# Altium footprint library GyokuRe.PcbLib: 1248 footprints (part 8 of 78)
Each footprint in its own frame and in the unit in brackets; x right, y up, seen from the top. Pads: shape width x height; smd on the part's side, far side on the other; paste and mask are expansions set on the pad; w line width, h text height; cw(c..) or ccw(c..) is an arc to the next point about the centre after c.
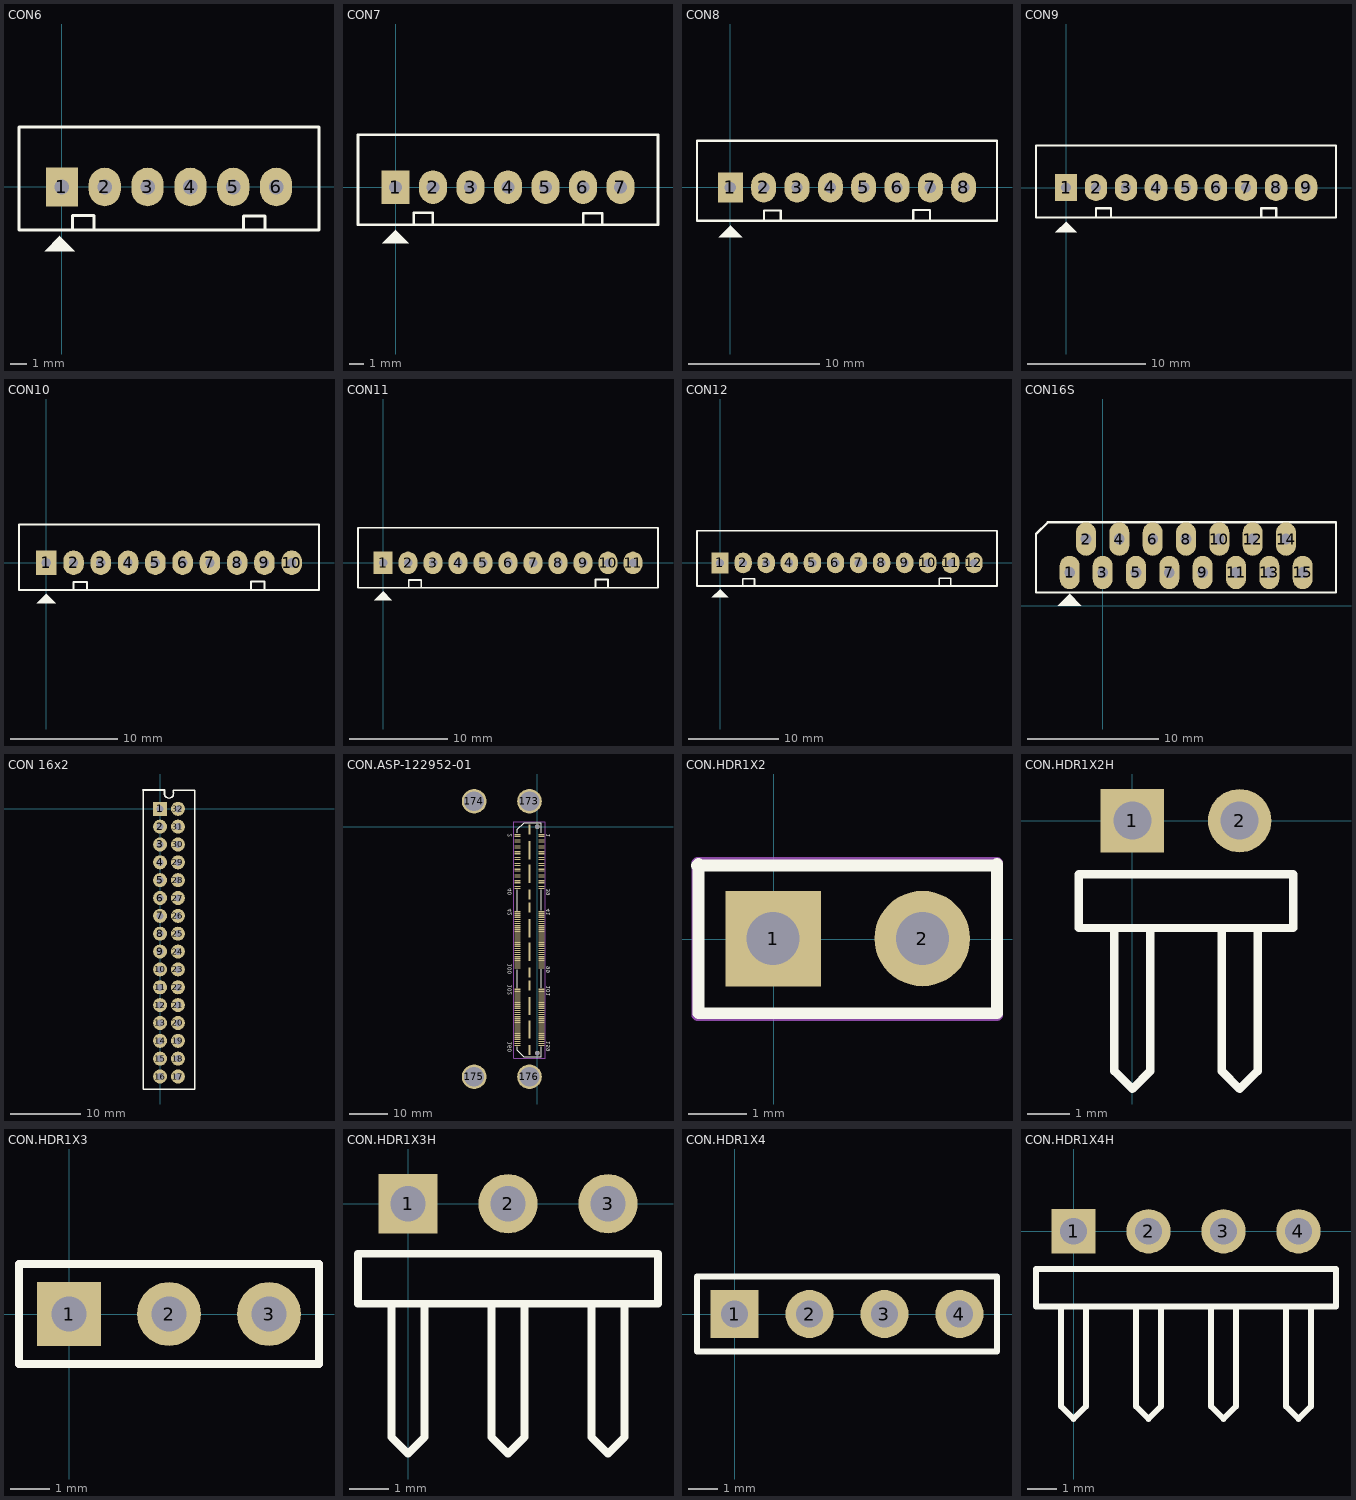
[diagram p7: the footprints below, top view; thin cyan lines are the x and y axes]

## CON6 [mil] "CON6"
height 200
pads (6):
  rect 75x90 hole 34: 1(0,0)
  oval 75x90 hole 34: 2(100,0) 3(200,0) 4(300,0) 5(400,0) 6(500,0)
Top Overlay:
  region: -40.5,-149.5 30.5,-149.5 -4.5,-114.5 -4.5,-113.5
  lines w7: 25,-97 25,-67 75,-67 75,-97 ; 424,-98 424,-68 474,-68 474,-98 ; -100,-100 -100,140 600,140 600,0 600,-100 -100,-100

## CON7 [mil] "CON7"
height 200
pads (7):
  rect 75x90 hole 34: 1(0,0)
  oval 75x90 hole 34: 2(100,0) 3(200,0) 4(300,0) 5(400,0) 6(500,0) 7(600,0)
Top Overlay:
  region: -35.5,-149.5 35.5,-149.5 0.5,-114.5 0.5,-113.5
  lines w7: 49,-98 49,-68 99,-68 99,-98 ; 501,-99 501,-69 551,-69 551,-99 ; -100,-100 -100,140 700,140 700,0 700,-100 -100,-100

## CON8 [mil] "CON8"
height 200
pads (8):
  rect 75x90 hole 34: 1(0,0)
  oval 75x90 hole 34: 2(100,0) 3(200,0) 4(300,0) 5(400,0) 6(500,0) 7(600,0) 8(700,0)
Top Overlay:
  region: -35.5,-149.5 35.5,-149.5 0.5,-114.5 0.5,-113.5
  lines w7: 101,-99 101,-69 151,-69 151,-99 ; 549,-98 549,-68 599,-68 599,-98 ; -100,-100 800,-100 800,0 800,140 -100,140 -100,-100

## CON9 [mil] "CON9"
height 200
pads (9):
  rect 75x90 hole 34: 1(0,0)
  oval 75x90 hole 34: 2(100,0) 3(200,0) 4(300,0) 5(400,0) 6(500,0) 7(600,0) 8(700,0) 9(800,0)
Top Overlay:
  region: -35.5,-149.5 35.5,-149.5 0.5,-114.5 0.5,-113.5
  lines w7: 100,-99 100,-69 150,-69 150,-99 ; 651,-99 651,-69 701,-69 701,-99 ; -100,-100 -100,140 900,140 900,0 900,-100 -100,-100

## CON10 [mil] "CON10"
height 200
pads (10):
  rect 75x90 hole 34: 1(0,0)
  oval 75x90 hole 34: 2(100,0) 3(200,0) 4(300,0) 5(400,0) 6(500,0) 7(600,0) 8(700,0) 9(800,0) 10(900,0)
Top Overlay:
  region: -35.5,-149.5 35.5,-149.5 0.5,-114.5 0.5,-113.5
  lines w7: 100,-100 100,-70 150,-70 150,-100 ; 750,-99 750,-69 800,-69 800,-99 ; -100,-100 1000,-100 1000,0 1000,140 -100,140 -100,-100

## CON11 [mil] "CON11"
height 200
pads (11):
  rect 75x90 hole 34: 1(0,0)
  oval 75x90 hole 34: 2(100,0) 3(200,0) 4(300,0) 5(400,0) 6(500,0) 7(600,0) 8(700,0) 9(800,0) 10(900,0) 11(1000,0)
Top Overlay:
  region: -35.5,-149.5 35.5,-149.5 0.5,-114.5 0.5,-113.5
  lines w7: 103,-99 103,-69 153,-69 153,-99 ; 850,-97 850,-67 900,-67 900,-97 ; -100,-100 1100,-100 1100,0 1100,140 -100,140 -100,-100

## CON12 [mil] "CON12"
height 200
pads (12):
  rect 75x90 hole 34: 1(0,0)
  oval 75x90 hole 34: 2(100,0) 3(200,0) 4(300,0) 5(400,0) 6(500,0) 7(600,0) 8(700,0) 9(800,0) 10(900,0) 11(1000,0) 12(1100,0)
Top Overlay:
  region: -35.5,-149.5 35.5,-149.5 0.5,-114.5 0.5,-113.5
  lines w7: 99,-99 99,-69 149,-69 149,-99 ; 950,-97 950,-67 1000,-67 1000,-97 ; -100,-100 1200,-100 1200,0 1200,140 -100,140 -100,-100

## CON16S [mil] "Jam 16S"
pads (15):
  oval 60x100 hole 32: 1(-99,100) 2(-50,200) 3(0,100) 4(50,200) 5(100,100) 6(150,200) 7(200,100) 8(250,200) 9(300,100) 10(350,200) 11(400,100) 12(450,200) 13(500,100) 14(550,200) 15(600,100)
Top Overlay:
  region: -135.5,0.5 -64.5,0.5 -99.5,35.5 -99.5,36.5
  lines w7: -200,40 -200,215 -165,250 700,250 700,40 -200,40

## CON 16x2 [mm]
pads (32):
  rect 2x2 hole 1: 1(0,0)
  round 2 hole 1: 2(0,-2.54) 3(0,-5.08) 4(0,-7.62) 5(0,-10.16) 6(0,-12.7) 7(0,-15.24) 8(0,-17.78) 9(0,-20.32) 10(0,-22.86) 11(0,-25.4) 12(0,-27.94) 13(0,-30.48) 14(0,-33.02) 15(0,-35.56) 16(0,-38.1) 17(2.54,-38.1) 18(2.54,-35.56) 19(2.54,-33.02) 20(2.54,-30.48) 21(2.54,-27.94) 22(2.54,-25.4) 23(2.54,-22.86) 24(2.54,-20.32) 25(2.54,-17.78) 26(2.54,-15.24) 27(2.54,-12.7) 28(2.54,-10.16) 29(2.54,-7.62) 30(2.54,-5.08) 31(2.54,-2.54) 32(2.54,0)
Top Overlay:
  lines w0.2: -2.413,2.667 -2.413,-39.878 4.953,-39.878 4.953,2.667 1.905,2.667 1.905,2.286 cw(c1.27,2.17) 0.635,2.286
  lines w0.254: -2.413,2.667 0.635,2.667 0.635,2.032

## CON.ASP-122952-01 [mm] "HSMC Male Connector"
pads (178):
  rect 1.45x0.3 smd paste+0 mask+0: 1(1.06,-1.99) 2(-5.12,-1.99) 3(1.06,-2.49) 4(-5.12,-2.49) 5(1.06,-3.49) 6(-5.12,-3.49) 7(1.06,-3.99) 8(-5.12,-3.99) 9(1.06,-4.99) 10(-5.12,-4.99) 11(1.06,-5.49) 12(-5.12,-5.49) 13(1.06,-6.49) 14(-5.12,-6.49) 15(1.06,-6.99) 16(-5.12,-6.99) 17(1.06,-7.99) 18(-5.12,-7.99) 19(1.06,-8.49) 20(-5.12,-8.49) 21(1.06,-9.49) 22(-5.12,-9.49) 23(1.06,-9.99) 24(-5.12,-9.99) 25(1.06,-10.99) 26(-5.12,-10.99) 27(1.06,-11.49) 28(-5.12,-11.49) 29(1.06,-12.49) 30(-5.12,-12.49) 31(1.06,-12.99) 32(-5.12,-12.99) 33(1.06,-13.99) 34(-5.12,-13.99) 35(1.06,-14.49) 36(-5.12,-14.49) 37(1.06,-15.49) 38(-5.12,-15.49) 39(1.06,-15.99) 40(-5.12,-15.99) 41(1.06,-21.99) 42(-5.12,-21.99) 43(1.06,-22.49) 44(-5.12,-22.49) 45(1.06,-22.99) 46(-5.12,-22.99) 47(1.06,-23.49) 48(-5.12,-23.49) 49(1.06,-23.99) 50(-5.12,-23.99) 51(1.06,-24.49) 52(-5.12,-24.49) 53(1.06,-24.99) 54(-5.12,-24.99) 55(1.06,-25.49) 56(-5.12,-25.49) 57(1.06,-25.99) 58(-5.12,-25.99) 59(1.06,-26.49) 60(-5.12,-26.49) 61(1.06,-26.99) 62(-5.12,-26.99) 63(1.06,-27.49) 64(-5.12,-27.49) 65(1.06,-27.99) 66(-5.12,-27.99) 67(1.06,-28.49) 68(-5.12,-28.49) 69(1.06,-28.99) 70(-5.12,-28.99) 71(1.06,-29.49) 72(-5.12,-29.49) 73(1.06,-29.99) 74(-5.12,-29.99) 75(1.06,-30.49) 76(-5.12,-30.49) 77(1.06,-30.99) 78(-5.12,-30.99) 79(1.06,-31.49) 80(-5.12,-31.49) 81(1.06,-31.99) 82(-5.12,-31.99) 83(1.06,-32.49) 84(-5.12,-32.49) 85(1.06,-32.99) 86(-5.12,-32.99) 87(1.06,-33.49) 88(-5.12,-33.49) 89(1.06,-33.99) 90(-5.12,-33.99) 91(1.06,-34.49) 92(-5.12,-34.49) 93(1.06,-34.99) 94(-5.12,-34.99) 95(1.06,-35.49) 96(-5.12,-35.49) 97(1.06,-35.99) 98(-5.12,-35.99) 99(1.06,-36.49) 100(-5.12,-36.49) 101(1.06,-41.99) 102(-5.12,-41.99) 103(1.06,-42.49) 104(-5.12,-42.49) 105(1.06,-42.99) 106(-5.12,-42.99) 107(1.06,-43.49) 108(-5.12,-43.49) 109(1.06,-43.99) 110(-5.12,-43.99) 111(1.06,-44.49) 112(-5.12,-44.49) 113(1.06,-44.99) 114(-5.12,-44.99) 115(1.06,-45.49) 116(-5.12,-45.49) 117(1.06,-45.99) 118(-5.12,-45.99) 119(1.06,-46.49) 120(-5.12,-46.49) 121(1.06,-46.99) 122(-5.12,-46.99) 123(1.06,-47.49) 124(-5.12,-47.49) 125(1.06,-47.99) 126(-5.12,-47.99) 127(1.06,-48.49) 128(-5.12,-48.49) 129(1.06,-48.99) 130(-5.12,-48.99) 131(1.06,-49.49) 132(-5.12,-49.49) 133(1.06,-49.99) 134(-5.12,-49.99) 135(1.06,-50.49) 136(-5.12,-50.49) 137(1.06,-50.99) 138(-5.12,-50.99) 139(1.06,-51.49) 140(-5.12,-51.49) 141(1.06,-51.99) 142(-5.12,-51.99) 143(1.06,-52.49) 144(-5.12,-52.49) 145(1.06,-52.99) 146(-5.12,-52.99) 147(1.06,-53.49) 148(-5.12,-53.49) 149(1.06,-53.99) 150(-5.12,-53.99) 151(1.06,-54.49) 152(-5.12,-54.49) 153(1.06,-54.99) 154(-5.12,-54.99) 155(1.06,-55.49) 156(-5.12,-55.49) 157(1.06,-55.99) 158(-5.12,-55.99) 159(1.06,-56.49) 160(-5.12,-56.49)
  rect 0.64x2.54 smd paste+0 mask+0: 161(-2.03,-57.715) 164(-2.03,-40.99) 165(-2.03,-37.64) 168(-2.03,-20.915) 169(-2.03,-17.49) 172(-2.03,-0.765)
  rect 0.64x4.7 smd paste+0 mask+0: 162(-2.03,-52.39) 163(-2.03,-46.315) 166(-2.03,-32.315) 167(-2.03,-26.24) 170(-2.03,-12.165) 171(-2.03,-6.09)
  round 6.35 hole 5.08: 173(-2.039,6.544) 174(-16.339,6.544) 175(-16.339,-64.567) 176(-2.039,-64.567)
  round 1.2 hole 1.1 paste+0 mask+0: HOLE(0,-58.48) HOLE(0,0)
Top Overlay:
  lines w0.2: -5.19,-41.69 -5.19,-36.94 ; -5.165,-56.79 -5.165,-57.79 -3.49,-59.465 1.01,-59.465 1.01,-56.84 ; -5.165,-21.665 -5.165,-16.315 ; -5.165,-1.64 -5.165,-0.74 ; -5.165,-0.715 -3.44,1.01 1.01,1.01 1.01,-1.64 ; 1.01,-41.59 1.01,-36.84 ; 1.01,-21.615 1.01,-16.34
  text "1" at 3.325,-1.85 h1
  text "2" at -6.625,-1.85 h1
  text "40" at -6.6,-15.95 h1
  text "42" at -6.6,-21.2 h1
  text "100" at -6.6,-35.425 h1
  text "102" at -6.6,-40.775 h1
  text "160" at -6.6,-55.575 h1
  text "39" at 3.325,-16.025 h1
  text "41" at 3.325,-21.15 h1
  text "99" at 3.325,-36.075 h1
  text "101" at 3.325,-41.125 h1
  text "159" at 3.35,-55.35 h1
Mechanical 13:
  lines w0.2: -6.115,-59.74 2.06,-59.74 2.06,1.26 -6.115,1.26 -6.115,-59.74
3D body: height 3.5, standoff 0.05, extent -2.227,-37.465 -1.852,-20.99
3D body: height 3.5, standoff 0.05, extent -2.227,-58.165 -1.852,-41.765
3D body: height 1.78, standoff 0.05, extent -4.54,-58.84 0.324,0.46
3D body: height 3.5, standoff 0.05, extent -2.227,-16.665 -1.852,-0.265
3D body: height 0.75, standoff 0, extent -0.45,-0.425 0.45,0.475
3D body: height 0.75, standoff 0, extent -0.45,-58.93 0.45,-58.03
3D body: height 0.2, standoff 0.01, extent 0.435,-2.09 1.385,-1.89
3D body: height 4.27, standoff 0.1, extent -4.94,-20.815 0.785,-16.865
3D body: height 4.27, standoff 0.1, extent -4.94,-41.615 0.785,-37.59
3D body: height 0.2, standoff 0.01, extent 0.435,-2.59 1.385,-2.39
3D body: height 0.2, standoff 0.01, extent 0.435,-4.09 1.385,-3.89
3D body: height 0.2, standoff 0.01, extent 0.435,-3.59 1.385,-3.39
3D body: height 0.2, standoff 0.01, extent 0.435,-5.09 1.385,-4.89
3D body: height 0.2, standoff 0.01, extent 0.435,-5.59 1.385,-5.39
3D body: height 0.2, standoff 0.01, extent 0.435,-6.59 1.385,-6.39
3D body: height 0.2, standoff 0.01, extent 0.435,-7.09 1.385,-6.89
3D body: height 0.2, standoff 0.01, extent 0.435,-8.09 1.385,-7.89
3D body: height 0.2, standoff 0.01, extent 0.435,-8.59 1.385,-8.39
3D body: height 0.2, standoff 0.01, extent 0.435,-9.59 1.385,-9.39
3D body: height 0.2, standoff 0.01, extent 0.435,-10.09 1.385,-9.89
3D body: height 0.2, standoff 0.01, extent 0.435,-11.09 1.385,-10.89
3D body: height 0.2, standoff 0.01, extent 0.435,-11.59 1.385,-11.39
3D body: height 0.2, standoff 0.01, extent 0.435,-12.59 1.385,-12.39
3D body: height 0.2, standoff 0.01, extent 0.435,-13.09 1.385,-12.89
3D body: height 0.2, standoff 0.01, extent 0.435,-14.09 1.385,-13.89
3D body: height 0.2, standoff 0.01, extent 0.435,-14.59 1.385,-14.39
3D body: height 0.2, standoff 0.01, extent 0.435,-15.59 1.385,-15.39
3D body: height 0.2, standoff 0.01, extent 0.435,-16.09 1.385,-15.89
3D body: height 0.2, standoff 0.01, extent -5.44,-2.09 -4.49,-1.89
3D body: height 0.2, standoff 0.01, extent -5.44,-2.59 -4.49,-2.39
3D body: height 0.2, standoff 0.01, extent -5.44,-3.59 -4.49,-3.39
3D body: height 0.2, standoff 0.01, extent -5.44,-4.09 -4.49,-3.89
3D body: height 0.2, standoff 0.01, extent -5.44,-5.09 -4.49,-4.89
3D body: height 0.2, standoff 0.01, extent -5.44,-5.59 -4.49,-5.39
3D body: height 0.2, standoff 0.01, extent -5.44,-6.59 -4.49,-6.39
3D body: height 0.2, standoff 0.01, extent -5.44,-7.09 -4.49,-6.89
3D body: height 0.2, standoff 0.01, extent -5.44,-8.09 -4.49,-7.89
3D body: height 0.2, standoff 0.01, extent -5.44,-8.59 -4.49,-8.39
3D body: height 0.2, standoff 0.01, extent -5.44,-9.59 -4.49,-9.39
3D body: height 0.2, standoff 0.01, extent -5.44,-10.09 -4.49,-9.89
3D body: height 0.2, standoff 0.01, extent -5.44,-11.09 -4.49,-10.89
3D body: height 0.2, standoff 0.01, extent -5.44,-11.59 -4.49,-11.39
3D body: height 0.2, standoff 0.01, extent -5.44,-12.59 -4.49,-12.39
3D body: height 0.2, standoff 0.01, extent -5.44,-13.09 -4.49,-12.89
3D body: height 0.2, standoff 0.01, extent -5.44,-14.59 -4.49,-14.39
3D body: height 0.2, standoff 0.01, extent -5.44,-14.09 -4.49,-13.89
3D body: height 0.2, standoff 0.01, extent -5.44,-15.59 -4.49,-15.39
3D body: height 0.2, standoff 0.01, extent -5.44,-16.09 -4.49,-15.89
3D body: height 0.2, standoff 0.01, extent 0.435,-22.59 1.385,-22.39
3D body: height 0.2, standoff 0.01, extent 0.435,-22.09 1.385,-21.89
3D body: height 0.2, standoff 0.01, extent 0.435,-23.59 1.385,-23.39
3D body: height 0.2, standoff 0.01, extent 0.435,-23.09 1.385,-22.89
3D body: height 0.2, standoff 0.01, extent 0.435,-25.09 1.385,-24.89
3D body: height 0.2, standoff 0.01, extent 0.435,-25.59 1.385,-25.39
3D body: height 0.2, standoff 0.01, extent 0.435,-24.09 1.385,-23.89
3D body: height 0.2, standoff 0.01, extent 0.435,-24.59 1.385,-24.39
3D body: height 0.2, standoff 0.01, extent 0.435,-27.09 1.385,-26.89
3D body: height 0.2, standoff 0.01, extent 0.435,-27.59 1.385,-27.39
3D body: height 0.2, standoff 0.01, extent 0.435,-26.09 1.385,-25.89
3D body: height 0.2, standoff 0.01, extent 0.435,-26.59 1.385,-26.39
3D body: height 0.2, standoff 0.01, extent 0.435,-29.09 1.385,-28.89
3D body: height 0.2, standoff 0.01, extent 0.435,-29.59 1.385,-29.39
3D body: height 0.2, standoff 0.01, extent 0.435,-28.09 1.385,-27.89
3D body: height 0.2, standoff 0.01, extent 0.435,-28.59 1.385,-28.39
3D body: height 0.2, standoff 0.01, extent 0.435,-31.09 1.385,-30.89
3D body: height 0.2, standoff 0.01, extent 0.435,-31.59 1.385,-31.39
3D body: height 0.2, standoff 0.01, extent 0.435,-30.09 1.385,-29.89
3D body: height 0.2, standoff 0.01, extent 0.435,-30.59 1.385,-30.39
3D body: height 0.2, standoff 0.01, extent 0.435,-33.09 1.385,-32.89
3D body: height 0.2, standoff 0.01, extent 0.435,-33.59 1.385,-33.39
3D body: height 0.2, standoff 0.01, extent 0.435,-32.09 1.385,-31.89
3D body: height 0.2, standoff 0.01, extent 0.435,-32.59 1.385,-32.39
3D body: height 0.2, standoff 0.01, extent 0.435,-35.09 1.385,-34.89
3D body: height 0.2, standoff 0.01, extent 0.435,-35.59 1.385,-35.39
3D body: height 0.2, standoff 0.01, extent 0.435,-34.09 1.385,-33.89
3D body: height 0.2, standoff 0.01, extent 0.435,-34.59 1.385,-34.39
3D body: height 0.2, standoff 0.01, extent 0.435,-36.09 1.385,-35.89
3D body: height 0.2, standoff 0.01, extent 0.435,-36.59 1.385,-36.39
3D body: height 0.2, standoff 0.01, extent -5.44,-22.09 -4.49,-21.89
3D body: height 0.2, standoff 0.01, extent -5.44,-22.59 -4.49,-22.39
3D body: height 0.2, standoff 0.01, extent -5.44,-24.09 -4.49,-23.89
3D body: height 0.2, standoff 0.01, extent -5.44,-24.59 -4.49,-24.39
3D body: height 0.2, standoff 0.01, extent -5.44,-23.09 -4.49,-22.89
3D body: height 0.2, standoff 0.01, extent -5.44,-23.59 -4.49,-23.39
3D body: height 0.2, standoff 0.01, extent -5.44,-26.09 -4.49,-25.89
3D body: height 0.2, standoff 0.01, extent -5.44,-26.59 -4.49,-26.39
3D body: height 0.2, standoff 0.01, extent -5.44,-25.09 -4.49,-24.89
3D body: height 0.2, standoff 0.01, extent -5.44,-25.59 -4.49,-25.39
3D body: height 0.2, standoff 0.01, extent -5.44,-28.09 -4.49,-27.89
3D body: height 0.2, standoff 0.01, extent -5.44,-28.59 -4.49,-28.39
3D body: height 0.2, standoff 0.01, extent -5.44,-27.09 -4.49,-26.89
3D body: height 0.2, standoff 0.01, extent -5.44,-27.59 -4.49,-27.39
3D body: height 0.2, standoff 0.01, extent -5.44,-30.09 -4.49,-29.89
3D body: height 0.2, standoff 0.01, extent -5.44,-30.59 -4.49,-30.39
3D body: height 0.2, standoff 0.01, extent -5.44,-29.09 -4.49,-28.89
3D body: height 0.2, standoff 0.01, extent -5.44,-29.59 -4.49,-29.39
3D body: height 0.2, standoff 0.01, extent -5.44,-32.09 -4.49,-31.89
3D body: height 0.2, standoff 0.01, extent -5.44,-32.59 -4.49,-32.39
3D body: height 0.2, standoff 0.01, extent -5.44,-31.09 -4.49,-30.89
3D body: height 0.2, standoff 0.01, extent -5.44,-31.59 -4.49,-31.39
3D body: height 0.2, standoff 0.01, extent -5.44,-34.09 -4.49,-33.89
3D body: height 0.2, standoff 0.01, extent -5.44,-34.59 -4.49,-34.39
3D body: height 0.2, standoff 0.01, extent -5.44,-33.09 -4.49,-32.89
3D body: height 0.2, standoff 0.01, extent -5.44,-33.59 -4.49,-33.39
3D body: height 0.2, standoff 0.01, extent -5.44,-35.59 -4.49,-35.39
3D body: height 0.2, standoff 0.01, extent -5.44,-35.09 -4.49,-34.89
3D body: height 0.2, standoff 0.01, extent -5.44,-36.59 -4.49,-36.39
3D body: height 0.2, standoff 0.01, extent -5.44,-36.09 -4.49,-35.89
3D body: height 0.2, standoff 0.01, extent 0.435,-56.59 1.385,-56.39
3D body: height 0.2, standoff 0.01, extent 0.435,-56.09 1.385,-55.89
3D body: height 0.2, standoff 0.01, extent 0.435,-54.59 1.385,-54.39
3D body: height 0.2, standoff 0.01, extent 0.435,-54.09 1.385,-53.89
3D body: height 0.2, standoff 0.01, extent 0.435,-55.59 1.385,-55.39
3D body: height 0.2, standoff 0.01, extent 0.435,-55.09 1.385,-54.89
3D body: height 0.2, standoff 0.01, extent 0.435,-52.59 1.385,-52.39
3D body: height 0.2, standoff 0.01, extent 0.435,-52.09 1.385,-51.89
3D body: height 0.2, standoff 0.01, extent 0.435,-53.59 1.385,-53.39
3D body: height 0.2, standoff 0.01, extent 0.435,-53.09 1.385,-52.89
3D body: height 0.2, standoff 0.01, extent 0.435,-50.59 1.385,-50.39
3D body: height 0.2, standoff 0.01, extent 0.435,-50.09 1.385,-49.89
3D body: height 0.2, standoff 0.01, extent 0.435,-51.59 1.385,-51.39
3D body: height 0.2, standoff 0.01, extent 0.435,-51.09 1.385,-50.89
3D body: height 0.2, standoff 0.01, extent 0.435,-48.59 1.385,-48.39
3D body: height 0.2, standoff 0.01, extent 0.435,-48.09 1.385,-47.89
3D body: height 0.2, standoff 0.01, extent 0.435,-49.59 1.385,-49.39
3D body: height 0.2, standoff 0.01, extent 0.435,-49.09 1.385,-48.89
3D body: height 0.2, standoff 0.01, extent 0.435,-46.59 1.385,-46.39
3D body: height 0.2, standoff 0.01, extent 0.435,-46.09 1.385,-45.89
3D body: height 0.2, standoff 0.01, extent 0.435,-47.59 1.385,-47.39
3D body: height 0.2, standoff 0.01, extent 0.435,-47.09 1.385,-46.89
3D body: height 0.2, standoff 0.01, extent 0.435,-44.59 1.385,-44.39
3D body: height 0.2, standoff 0.01, extent 0.435,-44.09 1.385,-43.89
3D body: height 0.2, standoff 0.01, extent 0.435,-45.59 1.385,-45.39
3D body: height 0.2, standoff 0.01, extent 0.435,-45.09 1.385,-44.89
3D body: height 0.2, standoff 0.01, extent 0.435,-43.09 1.385,-42.89
3D body: height 0.2, standoff 0.01, extent 0.435,-43.59 1.385,-43.39
3D body: height 0.2, standoff 0.01, extent 0.435,-42.09 1.385,-41.89
3D body: height 0.2, standoff 0.01, extent 0.435,-42.59 1.385,-42.39
3D body: height 0.2, standoff 0.01, extent -5.44,-42.09 -4.49,-41.89
3D body: height 0.2, standoff 0.01, extent -5.44,-42.59 -4.49,-42.39
3D body: height 0.2, standoff 0.01, extent -5.44,-44.09 -4.49,-43.89
3D body: height 0.2, standoff 0.01, extent -5.44,-44.59 -4.49,-44.39
3D body: height 0.2, standoff 0.01, extent -5.44,-43.09 -4.49,-42.89
3D body: height 0.2, standoff 0.01, extent -5.44,-43.59 -4.49,-43.39
3D body: height 0.2, standoff 0.01, extent -5.44,-46.09 -4.49,-45.89
3D body: height 0.2, standoff 0.01, extent -5.44,-46.59 -4.49,-46.39
3D body: height 0.2, standoff 0.01, extent -5.44,-45.09 -4.49,-44.89
3D body: height 0.2, standoff 0.01, extent -5.44,-45.59 -4.49,-45.39
3D body: height 0.2, standoff 0.01, extent -5.44,-48.09 -4.49,-47.89
3D body: height 0.2, standoff 0.01, extent -5.44,-48.59 -4.49,-48.39
3D body: height 0.2, standoff 0.01, extent -5.44,-47.09 -4.49,-46.89
3D body: height 0.2, standoff 0.01, extent -5.44,-47.59 -4.49,-47.39
3D body: height 0.2, standoff 0.01, extent -5.44,-50.09 -4.49,-49.89
3D body: height 0.2, standoff 0.01, extent -5.44,-50.59 -4.49,-50.39
3D body: height 0.2, standoff 0.01, extent -5.44,-49.09 -4.49,-48.89
3D body: height 0.2, standoff 0.01, extent -5.44,-49.59 -4.49,-49.39
3D body: height 0.2, standoff 0.01, extent -5.44,-52.09 -4.49,-51.89
3D body: height 0.2, standoff 0.01, extent -5.44,-52.59 -4.49,-52.39
3D body: height 0.2, standoff 0.01, extent -5.44,-51.09 -4.49,-50.89
3D body: height 0.2, standoff 0.01, extent -5.44,-51.59 -4.49,-51.39
3D body: height 0.2, standoff 0.01, extent -5.44,-54.09 -4.49,-53.89
3D body: height 0.2, standoff 0.01, extent -5.44,-54.59 -4.49,-54.39
3D body: height 0.2, standoff 0.01, extent -5.44,-53.09 -4.49,-52.89
3D body: height 0.2, standoff 0.01, extent -5.44,-53.59 -4.49,-53.39
3D body: height 0.2, standoff 0.01, extent -5.44,-55.59 -4.49,-55.39
3D body: height 0.2, standoff 0.01, extent -5.44,-55.09 -4.49,-54.89
3D body: height 0.2, standoff 0.01, extent -5.44,-56.59 -4.49,-56.39
3D body: height 0.2, standoff 0.01, extent -5.44,-56.09 -4.49,-55.89
3D body: height 4.27, standoff 0.05, extent -4.05,-2.1 -3.8,-1.9
3D body: height 4.27, standoff 0.05, extent -4.05,-2.6 -3.8,-2.4
3D body: height 4.27, standoff 0.05, extent -4.05,-4.1 -3.8,-3.9
3D body: height 4.27, standoff 0.05, extent -4.05,-3.6 -3.8,-3.4
3D body: height 4.27, standoff 0.05, extent -4.05,-5.6 -3.8,-5.4
3D body: height 4.27, standoff 0.05, extent -4.05,-5.1 -3.8,-4.9
3D body: height 4.27, standoff 0.05, extent -4.05,-7.1 -3.8,-6.9
3D body: height 4.27, standoff 0.05, extent -4.05,-6.6 -3.8,-6.4
3D body: height 4.27, standoff 0.05, extent -4.05,-8.6 -3.8,-8.4
3D body: height 4.27, standoff 0.05, extent -4.05,-8.1 -3.8,-7.9
3D body: height 4.27, standoff 0.05, extent -4.05,-10.1 -3.8,-9.9
3D body: height 4.27, standoff 0.05, extent -4.05,-9.6 -3.8,-9.4
3D body: height 4.27, standoff 0.05, extent -4.05,-11.6 -3.8,-11.4
3D body: height 4.27, standoff 0.05, extent -4.05,-11.1 -3.8,-10.9
3D body: height 4.27, standoff 0.05, extent -4.05,-13.1 -3.8,-12.9
3D body: height 4.27, standoff 0.05, extent -4.05,-12.6 -3.8,-12.4
3D body: height 4.27, standoff 0.05, extent -4.05,-14.6 -3.8,-14.4
3D body: height 4.27, standoff 0.05, extent -4.05,-14.1 -3.8,-13.9
3D body: height 4.27, standoff 0.05, extent -4.05,-16.1 -3.8,-15.9
3D body: height 4.27, standoff 0.05, extent -4.05,-15.6 -3.8,-15.4
3D body: height 4.27, standoff 0.05, extent -4.05,-22.575 -3.8,-22.375
3D body: height 4.27, standoff 0.05, extent -4.05,-22.075 -3.8,-21.875
3D body: height 4.27, standoff 0.05, extent -4.05,-23.6 -3.8,-23.4
3D body: height 4.27, standoff 0.05, extent -4.05,-23.1 -3.8,-22.9
3D body: height 4.27, standoff 0.05, extent -4.05,-24.575 -3.8,-24.375
3D body: height 4.27, standoff 0.05, extent -4.05,-24.075 -3.8,-23.875
3D body: height 4.27, standoff 0.05, extent -4.05,-25.575 -3.8,-25.375
3D body: height 4.27, standoff 0.05, extent -4.05,-25.075 -3.8,-24.875
3D body: height 4.27, standoff 0.05, extent -4.05,-26.575 -3.8,-26.375
3D body: height 4.27, standoff 0.05, extent -4.05,-26.075 -3.8,-25.875
3D body: height 4.27, standoff 0.05, extent -4.05,-27.6 -3.8,-27.4
3D body: height 4.27, standoff 0.05, extent -4.05,-27.1 -3.8,-26.9
3D body: height 4.27, standoff 0.05, extent -4.05,-28.6 -3.8,-28.4
3D body: height 4.27, standoff 0.05, extent -4.05,-28.1 -3.8,-27.9
3D body: height 4.27, standoff 0.05, extent -4.05,-29.6 -3.8,-29.4
3D body: height 4.27, standoff 0.05, extent -4.05,-29.1 -3.8,-28.9
3D body: height 4.27, standoff 0.05, extent -4.05,-30.6 -3.8,-30.4
3D body: height 4.27, standoff 0.05, extent -4.05,-30.1 -3.8,-29.9
3D body: height 4.27, standoff 0.05, extent -4.05,-31.6 -3.8,-31.4
3D body: height 4.27, standoff 0.05, extent -4.05,-31.1 -3.8,-30.9
3D body: height 4.27, standoff 0.05, extent -4.05,-32.6 -3.8,-32.4
3D body: height 4.27, standoff 0.05, extent -4.05,-32.1 -3.8,-31.9
3D body: height 4.27, standoff 0.05, extent -4.05,-33.6 -3.8,-33.4
3D body: height 4.27, standoff 0.05, extent -4.05,-33.1 -3.8,-32.9
3D body: height 4.27, standoff 0.05, extent -4.05,-34.6 -3.8,-34.4
3D body: height 4.27, standoff 0.05, extent -4.05,-34.1 -3.8,-33.9
3D body: height 4.27, standoff 0.05, extent -4.05,-35.6 -3.8,-35.4
3D body: height 4.27, standoff 0.05, extent -4.05,-35.1 -3.8,-34.9
3D body: height 4.27, standoff 0.05, extent -4.05,-36.6 -3.8,-36.4
3D body: height 4.27, standoff 0.05, extent -4.05,-36.1 -3.8,-35.9
3D body: height 4.27, standoff 0.05, extent -4.05,-45.1 -3.8,-44.9
3D body: height 4.27, standoff 0.05, extent -4.05,-45.6 -3.8,-45.4
3D body: height 4.27, standoff 0.05, extent -4.05,-44.1 -3.8,-43.9
3D body: height 4.27, standoff 0.05, extent -4.05,-44.6 -3.8,-44.4
3D body: height 4.27, standoff 0.05, extent -4.05,-43.125 -3.8,-42.925
3D body: height 4.27, standoff 0.05, extent -4.05,-43.625 -3.8,-43.425
3D body: height 4.27, standoff 0.05, extent -4.05,-42.1 -3.8,-41.9
3D body: height 4.27, standoff 0.05, extent -4.05,-42.6 -3.8,-42.4
3D body: height 4.27, standoff 0.05, extent -4.05,-49.1 -3.8,-48.9
3D body: height 4.27, standoff 0.05, extent -4.05,-49.6 -3.8,-49.4
3D body: height 4.27, standoff 0.05, extent -4.05,-48.1 -3.8,-47.9
3D body: height 4.27, standoff 0.05, extent -4.05,-48.6 -3.8,-48.4
3D body: height 4.27, standoff 0.05, extent -4.05,-47.125 -3.8,-46.925
3D body: height 4.27, standoff 0.05, extent -4.05,-47.625 -3.8,-47.425
3D body: height 4.27, standoff 0.05, extent -4.05,-46.1 -3.8,-45.9
3D body: height 4.27, standoff 0.05, extent -4.05,-46.6 -3.8,-46.4
3D body: height 4.27, standoff 0.05, extent -4.05,-53.1 -3.8,-52.9
3D body: height 4.27, standoff 0.05, extent -4.05,-53.6 -3.8,-53.4
3D body: height 4.27, standoff 0.05, extent -4.05,-52.1 -3.8,-51.9
3D body: height 4.27, standoff 0.05, extent -4.05,-52.6 -3.8,-52.4
3D body: height 4.27, standoff 0.05, extent -4.05,-51.125 -3.8,-50.925
3D body: height 4.27, standoff 0.05, extent -4.05,-51.625 -3.8,-51.425
3D body: height 4.27, standoff 0.05, extent -4.05,-50.1 -3.8,-49.9
3D body: height 4.27, standoff 0.05, extent -4.05,-50.6 -3.8,-50.4
3D body: height 4.27, standoff 0.05, extent -4.05,-56.1 -3.8,-55.9
3D body: height 4.27, standoff 0.05, extent -4.05,-56.6 -3.8,-56.4
3D body: height 4.27, standoff 0.05, extent -4.05,-55.125 -3.8,-54.925
3D body: height 4.27, standoff 0.05, extent -4.05,-55.625 -3.8,-55.425
3D body: height 4.27, standoff 0.05, extent -4.05,-54.1 -3.8,-53.9
3D body: height 4.27, standoff 0.05, extent -4.05,-54.6 -3.8,-54.4
3D body: height 4.27, standoff 0.05, extent -0.35,-56.6 -0.1,-56.4
3D body: height 4.27, standoff 0.05, extent -0.35,-56.1 -0.1,-55.9
3D body: height 4.27, standoff 0.05, extent -0.35,-55.6 -0.1,-55.4
3D body: height 4.27, standoff 0.05, extent -0.35,-55.1 -0.1,-54.9
3D body: height 4.27, standoff 0.05, extent -0.35,-54.6 -0.1,-54.4
3D body: height 4.27, standoff 0.05, extent -0.35,-54.1 -0.1,-53.9
3D body: height 4.27, standoff 0.05, extent -0.35,-53.6 -0.1,-53.4
3D body: height 4.27, standoff 0.05, extent -0.35,-53.1 -0.1,-52.9
3D body: height 4.27, standoff 0.05, extent -0.35,-52.6 -0.1,-52.4
3D body: height 4.27, standoff 0.05, extent -0.35,-52.1 -0.1,-51.9
3D body: height 4.27, standoff 0.05, extent -0.35,-51.6 -0.1,-51.4
3D body: height 4.27, standoff 0.05, extent -0.35,-51.1 -0.1,-50.9
3D body: height 4.27, standoff 0.05, extent -0.35,-50.6 -0.1,-50.4
3D body: height 4.27, standoff 0.05, extent -0.35,-50.1 -0.1,-49.9
3D body: height 4.27, standoff 0.05, extent -0.35,-49.6 -0.1,-49.4
3D body: height 4.27, standoff 0.05, extent -0.35,-49.1 -0.1,-48.9
3D body: height 4.27, standoff 0.05, extent -0.35,-43.6 -0.1,-43.4
3D body: height 4.27, standoff 0.05, extent -0.35,-43.1 -0.1,-42.9
3D body: height 4.27, standoff 0.05, extent -0.35,-48.6 -0.1,-48.4
3D body: height 4.27, standoff 0.05, extent -0.35,-48.1 -0.1,-47.9
3D body: height 4.27, standoff 0.05, extent -0.35,-47.6 -0.1,-47.4
3D body: height 4.27, standoff 0.05, extent -0.35,-47.1 -0.1,-46.9
3D body: height 4.27, standoff 0.05, extent -0.35,-44.1 -0.1,-43.9
3D body: height 4.27, standoff 0.05, extent -0.35,-44.6 -0.1,-44.4
3D body: height 4.27, standoff 0.05, extent -0.35,-45.1 -0.1,-44.9
3D body: height 4.27, standoff 0.05, extent -0.35,-45.6 -0.1,-45.4
3D body: height 4.27, standoff 0.05, extent -0.35,-46.1 -0.1,-45.9
3D body: height 4.27, standoff 0.05, extent -0.35,-46.6 -0.1,-46.4
3D body: height 4.27, standoff 0.05, extent -0.35,-42.1 -0.1,-41.9
3D body: height 4.27, standoff 0.05, extent -0.35,-42.6 -0.1,-42.4
3D body: height 4.27, standoff 0.05, extent -0.35,-35.6 -0.1,-35.4
3D body: height 4.27, standoff 0.05, extent -0.35,-35.1 -0.1,-34.9
3D body: height 4.27, standoff 0.05, extent -0.35,-36.1 -0.1,-35.9
3D body: height 4.27, standoff 0.05, extent -0.35,-36.6 -0.1,-36.4
3D body: height 4.27, standoff 0.05, extent -0.35,-33.6 -0.1,-33.4
3D body: height 4.27, standoff 0.05, extent -0.35,-33.1 -0.1,-32.9
3D body: height 4.27, standoff 0.05, extent -0.35,-34.1 -0.1,-33.9
3D body: height 4.27, standoff 0.05, extent -0.35,-34.6 -0.1,-34.4
3D body: height 4.27, standoff 0.05, extent -0.35,-31.6 -0.1,-31.4
3D body: height 4.27, standoff 0.05, extent -0.35,-31.1 -0.1,-30.9
3D body: height 4.27, standoff 0.05, extent -0.35,-32.1 -0.1,-31.9
3D body: height 4.27, standoff 0.05, extent -0.35,-32.6 -0.1,-32.4
3D body: height 4.27, standoff 0.05, extent -0.35,-29.6 -0.1,-29.4
3D body: height 4.27, standoff 0.05, extent -0.35,-29.1 -0.1,-28.9
3D body: height 4.27, standoff 0.05, extent -0.35,-30.1 -0.1,-29.9
3D body: height 4.27, standoff 0.05, extent -0.35,-30.6 -0.1,-30.4
3D body: height 4.27, standoff 0.05, extent -0.35,-27.6 -0.1,-27.4
3D body: height 4.27, standoff 0.05, extent -0.35,-27.1 -0.1,-26.9
3D body: height 4.27, standoff 0.05, extent -0.35,-28.1 -0.1,-27.9
3D body: height 4.27, standoff 0.05, extent -0.35,-28.6 -0.1,-28.4
3D body: height 4.27, standoff 0.05, extent -0.35,-25.6 -0.1,-25.4
3D body: height 4.27, standoff 0.05, extent -0.35,-25.1 -0.1,-24.9
3D body: height 4.27, standoff 0.05, extent -0.35,-26.1 -0.1,-25.9
3D body: height 4.27, standoff 0.05, extent -0.35,-26.6 -0.1,-26.4
3D body: height 4.27, standoff 0.05, extent -0.35,-23.6 -0.1,-23.4
3D body: height 4.27, standoff 0.05, extent -0.35,-23.1 -0.1,-22.9
3D body: height 4.27, standoff 0.05, extent -0.35,-24.1 -0.1,-23.9
3D body: height 4.27, standoff 0.05, extent -0.35,-24.6 -0.1,-24.4
3D body: height 4.27, standoff 0.05, extent -0.35,-22.1 -0.1,-21.9
3D body: height 4.27, standoff 0.05, extent -0.35,-22.6 -0.1,-22.4
3D body: height 4.27, standoff 0.05, extent -0.35,-14.6 -0.1,-14.4
3D body: height 4.27, standoff 0.05, extent -0.35,-15.6 -0.1,-15.4
3D body: height 4.27, standoff 0.05, extent -0.35,-16.1 -0.1,-15.9
3D body: height 4.27, standoff 0.05, extent -0.35,-14.1 -0.1,-13.9
3D body: height 4.27, standoff 0.05, extent -0.35,-11.1 -0.1,-10.9
3D body: height 4.27, standoff 0.05, extent -0.35,-13.1 -0.1,-12.9
3D body: height 4.27, standoff 0.05, extent -0.35,-12.6 -0.1,-12.4
3D body: height 4.27, standoff 0.05, extent -0.35,-11.6 -0.1,-11.4
3D body: height 4.27, standoff 0.05, extent -0.35,-8.1 -0.1,-7.9
3D body: height 4.27, standoff 0.05, extent -0.35,-10.1 -0.1,-9.9
3D body: height 4.27, standoff 0.05, extent -0.35,-9.6 -0.1,-9.4
3D body: height 4.27, standoff 0.05, extent -0.35,-8.6 -0.1,-8.4
3D body: height 4.27, standoff 0.05, extent -0.35,-5.1 -0.1,-4.9
3D body: height 4.27, standoff 0.05, extent -0.35,-7.1 -0.1,-6.9
3D body: height 4.27, standoff 0.05, extent -0.35,-6.6 -0.1,-6.4
3D body: height 4.27, standoff 0.05, extent -0.35,-5.6 -0.1,-5.4
3D body: height 4.27, standoff 0.05, extent -0.35,-2.1 -0.1,-1.9
3D body: height 4.27, standoff 0.05, extent -0.35,-4.1 -0.1,-3.9
3D body: height 4.27, standoff 0.05, extent -0.35,-3.6 -0.1,-3.4
3D body: height 4.27, standoff 0.05, extent -0.35,-2.6 -0.1,-2.4
3D body: height 4.27, standoff 0.1, extent -4.94,-59.228 0.785,-29.315
3D body "ASP-122952-01.step": height 0, standoff 0, extent 1.516,0.71 1.516,0.71
3D body "ASP-122952-01.step": height 0, standoff 0, extent 1.71,0.185 1.71,0.185
3D body "ASP-122952-01.step": height 0, standoff 0, extent 1.01,-1.965 1.01,-1.965
3D body "ASP-122952-01.step": height 0, standoff 0, extent 0.685,0.66 0.685,0.66
3D body: height 4.27, standoff 0.1, extent -5.04,-29.49 0.91,0.76
3D body "ASP-122952-01.step": height 0, standoff 0, extent -5.065,-16.015 -5.065,-16.015

## CON.HDR1X2 [mil]
pads (2):
  rect 64x64 hole 35.43: 1(-0.44,0.28)
  round 64 hole 35.43: 2(99.56,0.28)
Top Overlay:
  lines w7.87: -51.44,49.28 148.56,49.28 ; -50.44,50.28 -50.44,-49.72 149.56,-49.72 149.56,50.28
Bottom Overlay:
  lines w7.87: -50.44,-49.72 149.56,-49.72 149.56,50.28 -50.44,50.28 -50.44,-49.72
Mechanical 13:
  lines w7.87: -51.18,-51.18 149.61,-51.18 149.61,51.18 -51.18,51.18 -51.18,-51.18
3D body: height 350, standoff -100, extent 89.56,-9.72 109.56,10.28
3D body: height 350, standoff -100, extent -10.44,-9.72 9.56,10.28
3D body: height 100, standoff 10, extent -51,-50 149,50

## CON.HDR1X2H [mm]
pads (2):
  rect 1.5x1.5 hole 0.9: 1(0,0)
  round 1.5 hole 0.9: 2(2.54,0)
Top Overlay:
  lines w0.2: -0.423,-2.54 -0.423,-5.927 0,-6.35 0.423,-5.927 0.423,-2.54 ; 2.117,-2.54 2.117,-5.927 2.54,-6.35 2.963,-5.927 2.963,-2.54 ; -1.27,-2.54 -1.27,-1.27 3.81,-1.27 3.81,-2.54 -1.27,-2.54

## CON.HDR1X3 [mil]
height 78
pads (3):
  rect 64x64 hole 35.43: 1(0,0)
  round 64 hole 35.43: 2(100,0) 3(200,0)
Top Overlay:
  lines w7.87: -50,-50 -50,50 250,50 250,-50 -50,-50
Bottom Overlay:
  lines w7.87: -50,-50 250,-50 250,50 -50,50 -50,-50
  text "." at -79,71 h39.37
Mechanical 13:
  lines w7.87: -50,-50 -50,50 250,50 250,-50 -50,-50
3D body: height 350, standoff -100, extent 190,-10 210,10
3D body: height 350, standoff -100, extent 90,-10 110,10
3D body: height 350, standoff -100, extent -10,-10 10,10
3D body: height 100, standoff 10, extent 50,-50 250,50
3D body: height 100, standoff 10, extent -50,-50 150,50

## CON.HDR1X3H [mm]
pads (3):
  rect 1.5x1.5 hole 0.9: 1(0,0)
  round 1.5 hole 0.9: 2(2.54,0) 3(5.08,0)
Top Overlay:
  lines w0.2: -0.423,-2.54 -0.423,-5.927 0,-6.35 0.423,-5.927 0.423,-2.54 ; 2.117,-2.54 2.117,-5.927 2.54,-6.35 2.963,-5.927 2.963,-2.54 ; 4.657,-2.54 4.657,-5.927 5.08,-6.35 5.503,-5.927 5.503,-2.54 ; -1.27,-2.54 6.35,-2.54 6.35,-1.27 -1.27,-1.27 -1.27,-2.54
  text "." at -2.286,0.635 h2.54

## CON.HDR1X4 [mil]
pads (4):
  rect 64x64 hole 35.43: 1(0,0)
  round 64 hole 35.43: 2(100,0) 3(200,0) 4(300,0)
Top Overlay:
  lines w7.87: -50,-50 -50,50 350,50 350,-50 -50,-50
  text "." at -86.65,59.04 h39.37
Bottom Overlay:
  lines w7.87: -50,-50 -50,50 350,50 350,-50 -50,-50
  text "." at -84.65,60.04 h39.37
3D body: height 100, standoff 10, extent 150,-50 350,50
3D body: height 100, standoff 10, extent 50,-50 250,50
3D body: height 100, standoff 10, extent -50,-50 150,50
3D body: height 350, standoff -100, extent -10,-10 10,10
3D body: height 350, standoff -100, extent 90,-10 110,10
3D body: height 350, standoff -100, extent 190,-10 210,10
3D body: height 350, standoff -100, extent 290,-10 310,10

## CON.HDR1X4H [mm]
pads (4):
  rect 1.5x1.5 hole 0.9: 1(0,0)
  round 1.5 hole 0.9: 2(2.54,0) 3(5.08,0) 4(7.62,0)
Top Overlay:
  lines w0.2: -0.423,-2.54 -0.423,-5.927 0,-6.35 0.423,-5.927 0.423,-2.54 ; 2.117,-2.54 2.117,-5.927 2.54,-6.35 2.963,-5.927 2.963,-2.54 ; 4.657,-2.54 4.657,-5.927 5.08,-6.35 5.503,-5.927 5.503,-2.54 ; 7.197,-2.54 7.197,-5.927 7.62,-6.35 8.043,-5.927 8.043,-2.54 ; -1.27,-2.54 -1.27,-1.27 8.89,-1.27 8.89,-2.54 -1.27,-2.54